# Altium footprint library ADP_Connector.PcbLib: 36 footprints (part 1 of 3)
Each footprint in its own frame and in the unit in brackets; x right, y up, seen from the top. Pads: shape width x height; smd on the part's side, far side on the other; paste and mask are expansions set on the pad; w line width, h text height; cw(c..) or ccw(c..) is an arc to the next point about the centre after c.
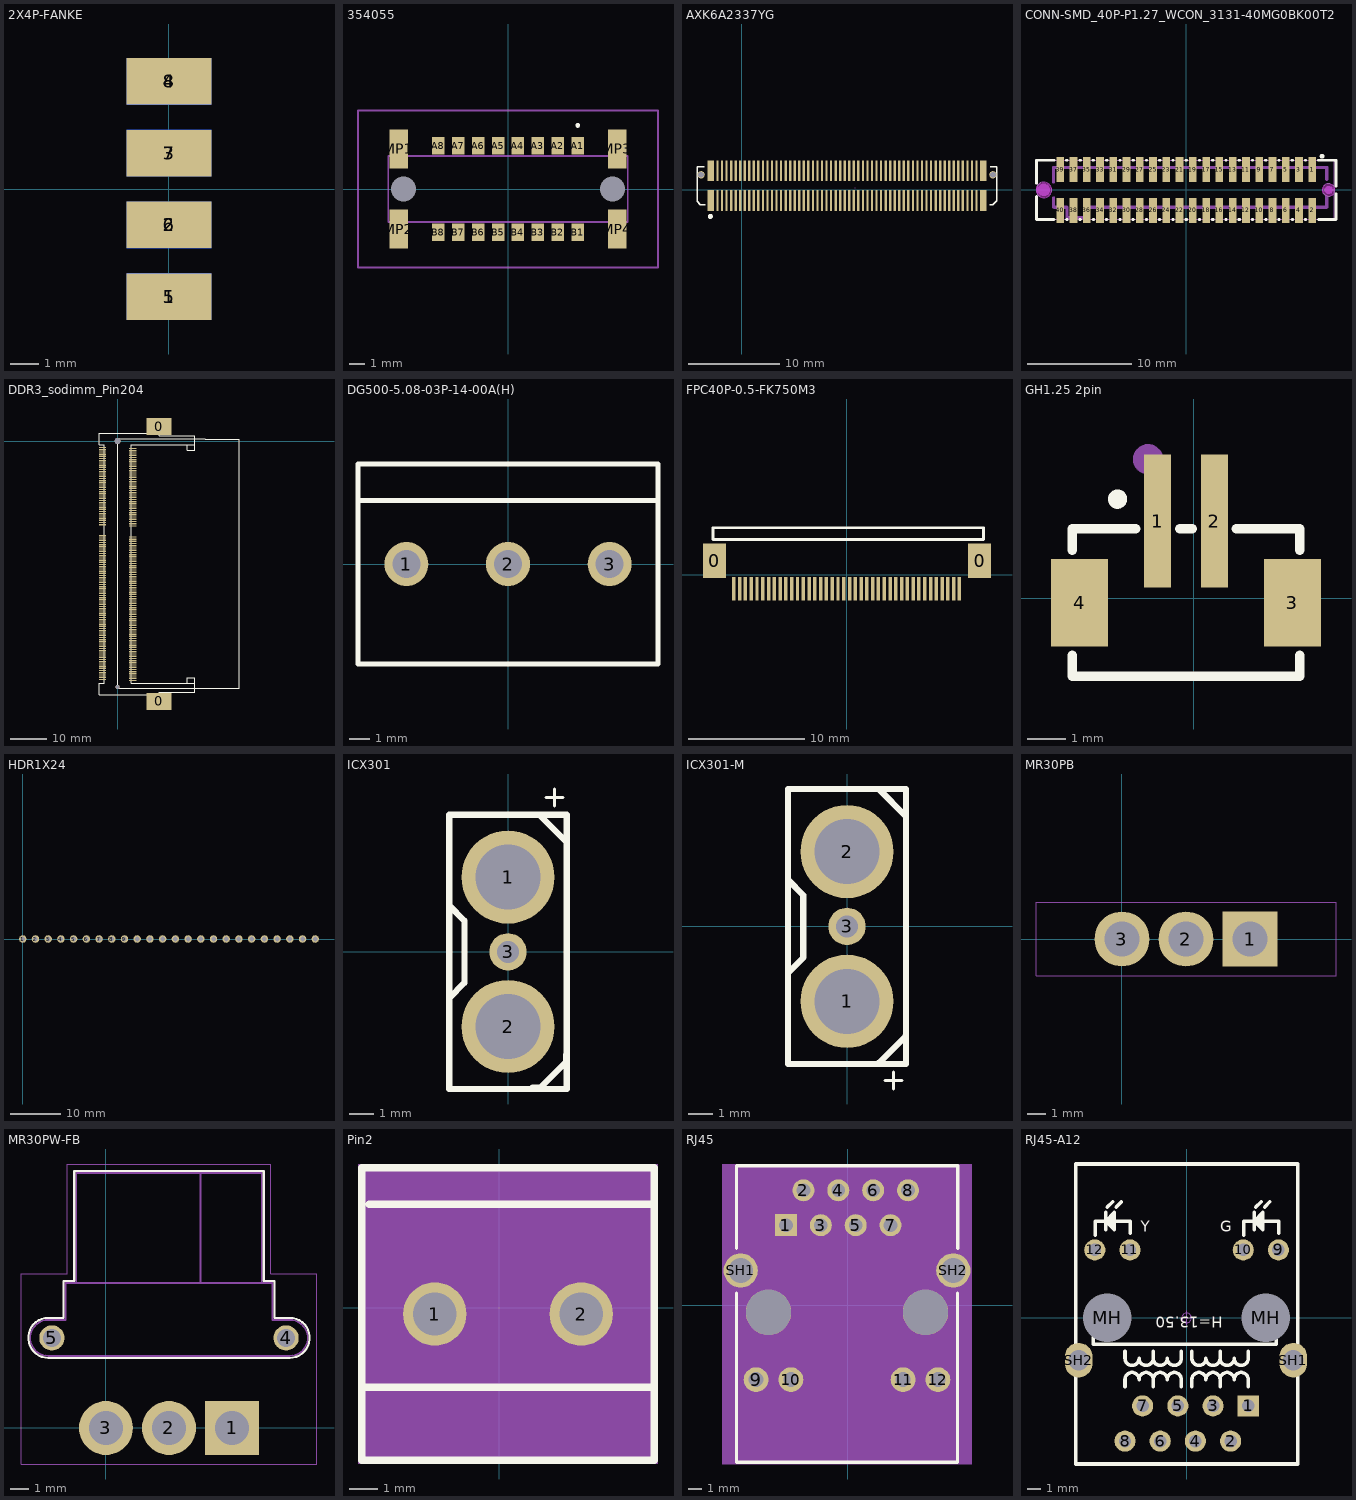
[diagram p0: the footprints below, top view; thin cyan lines are the x and y axes]

## 2X4P-FANKE [mm]
pads (8):
  rect 3x1.65 smd: 1(0,-3.81) 2(0,-1.27) 3(0,1.27) 4(0,3.81)
  rect 3x1.65 smd far side: 5(0,-3.81) 6(0,-1.27) 7(0,1.27) 8(0,3.81)
3D body "User Library-2_54mm Male Header (4x2).STEP": height 1.84, standoff -3.14, extent -1.249,-5.08 10.291,5.08

## 354055 [mm]
pads (22):
  rect 0.8x1.1 smd: A1(4.445,2.75) A2(3.175,2.75) A3(1.905,2.75) A4(0.635,2.75) A5(-0.635,2.75) A6(-1.905,2.75) A7(-3.175,2.75) A8(-4.445,2.75) B1(4.445,-2.75) B2(3.175,-2.75) B3(1.905,-2.75) B4(0.635,-2.75) B5(-0.635,-2.75) B6(-1.905,-2.75) B7(-3.175,-2.75) B8(-4.445,-2.75)
  round 0.8 hole 1.6 unplated: MH1(-6.655,0) MH2(6.655,0)
  rect 1.2x2.5 smd: MP1(-6.955,2.55) MP2(-6.955,-2.55) MP3(6.955,2.55) MP4(6.955,-2.55)
Top Overlay:
  lines w0.2: 4.445,4 ccw(c4.445,4.05) 4.445,4.1 ; 4.445,4 cw(c4.445,4.05) 4.445,4.1 ; 4.445,4 ccw(c4.445,4.05) 4.445,4.1
Mechanical 15:
  lines w0.1: -7.62,-2.1 7.62,-2.1 7.62,2.1 -7.62,2.1 -7.62,-2.1
Bottom Assembly:
  lines w0.1: -9.555,-5 9.555,-5 9.555,5 -9.555,5 -9.555,-5
3D body "354055.stp": height 5.8, standoff -4.65, extent -10,-3.376 10,3.376

## AXK6A2337YG [mm] "AXK6A2337YG-120PIN"
pads (122):
  round 0.8 hole 0.65: 1(-4.475,1.624) 2(27.625,1.624)
  rect 0.75x2.3 smd: 1(-3.425,-1.226) 2(-3.425,2.074) 119(26.575,-1.226) 120(26.575,2.074)
  rect 0.25x2.3 smd: 3(-2.675,-1.226) 4(-2.675,2.074) 5(-2.175,-1.226) 6(-2.175,2.074) 7(-1.675,-1.226) 8(-1.675,2.074) 9(-1.175,-1.226) 10(-1.175,2.074) 11(-0.675,-1.226) 12(-0.675,2.074) 13(-0.175,-1.226) 14(-0.175,2.074) 15(0.325,-1.226) 16(0.325,2.074) 17(0.825,-1.226) 18(0.825,2.074) 19(1.325,-1.226) 20(1.325,2.074) 21(1.825,-1.226) 22(1.825,2.074) 23(2.325,-1.226) 24(2.325,2.074) 25(2.825,-1.226) 26(2.825,2.074) 27(3.325,-1.226) 28(3.325,2.074) 29(3.825,-1.226) 30(3.825,2.074) 31(4.325,-1.226) 32(4.325,2.074) 33(4.825,-1.226) 34(4.825,2.074) 35(5.325,-1.226) 36(5.325,2.074) 37(5.825,-1.226) 38(5.825,2.074) 39(6.325,-1.226) 40(6.325,2.074) 41(6.825,-1.226) 42(6.825,2.074) 43(7.325,-1.226) 44(7.325,2.074) 45(7.825,-1.226) 46(7.825,2.074) 47(8.325,-1.226) 48(8.325,2.074) 49(8.825,-1.226) 50(8.825,2.074) 51(9.325,-1.226) 52(9.325,2.074) 53(9.825,-1.226) 54(9.825,2.074) 55(10.325,-1.226) 56(10.325,2.074) 57(10.825,-1.226) 58(10.825,2.074) 59(11.325,-1.226) 60(11.325,2.074) 61(11.825,-1.226) 62(11.825,2.074) 63(12.325,-1.226) 64(12.325,2.074) 65(12.825,-1.226) 66(12.825,2.074) 67(13.325,-1.226) 68(13.325,2.074) 69(13.825,-1.226) 70(13.825,2.074) 71(14.325,-1.226) 72(14.325,2.074) 73(14.825,-1.226) 74(14.825,2.074) 75(15.325,-1.226) 76(15.325,2.074) 77(15.825,-1.226) 78(15.825,2.074) 79(16.325,-1.226) 80(16.325,2.074) 81(16.825,-1.226) 82(16.825,2.074) 83(17.325,-1.226) 84(17.325,2.074) 85(17.825,-1.226) 86(17.825,2.074) 87(18.325,-1.226) 88(18.325,2.074) 89(18.825,-1.226) 90(18.825,2.074) 91(19.325,-1.226) 92(19.325,2.074) 93(19.825,-1.226) 94(19.825,2.074) 95(20.325,-1.226) 96(20.325,2.074) 97(20.825,-1.226) 98(20.825,2.074) 99(21.325,-1.226) 100(21.325,2.074) 101(21.825,-1.226) 102(21.825,2.074) 103(22.325,-1.226) 104(22.325,2.074) 105(22.825,-1.226) 106(22.825,2.074) 107(23.325,-1.226) 108(23.325,2.074) 109(23.825,-1.226) 110(23.825,2.074) 111(24.325,-1.226) 112(24.325,2.074) 113(24.825,-1.226) 114(24.825,2.074) 115(25.325,-1.226) 116(25.325,2.074) 117(25.825,-1.226) 118(25.825,2.074)
Top Overlay:
  lines w0.152: -4.122,2.524 -4.929,2.524 -4.929,-1.301 -4.554,-1.676 -4.046,-1.676 ; 27.272,-1.676 27.63,-1.676 28.079,-1.227 28.079,2.524 27.349,2.524
  lines w0.254: -3.61,-2.954 ccw(c-3.462,-2.954) -3.61,-2.947
Mechanical 1:
  text "95" at 20.325,-1.734 h0.64
  text "97" at 20.825,-1.734 h0.64
  text "73" at 14.825,-1.734 h0.64
  text "35" at 5.325,-1.734 h0.64
  text "71" at 14.325,-1.734 h0.64
  text "82" at 16.825,1.566 h0.64
  text "84" at 17.325,1.566 h0.64
  text "88" at 18.325,1.566 h0.64
  text "86" at 17.825,1.566 h0.64
  text "92" at 19.325,1.566 h0.64
  text "94" at 19.902,1.576 h0.64
  text "37" at 5.825,-1.734 h0.64
  text "91" at 19.582,-1.603 h0.64
  text "101" at 21.825,-1.988 h0.64
  text "103" at 22.325,-1.988 h0.64
  text "108" at 23.325,1.312 h0.64
  text "93" at 19.836,-1.734 h0.64
  text "107" at 23.325,-1.988 h0.64
  text "96" at 20.325,1.566 h0.64
  text "85" at 17.825,-1.734 h0.64
  text "98" at 20.825,1.566 h0.64
  text "104" at 22.325,1.312 h0.64
  text "87" at 18.325,-1.734 h0.64
  text "81" at 16.825,-1.734 h0.64
  text "105" at 22.825,-1.988 h0.64
  text "83" at 17.325,-1.734 h0.64
  text "102" at 21.825,1.312 h0.64
  text "106" at 22.825,1.312 h0.64
  text "120" at 26.575,1.312 h0.64
  text "121" at -4.475,0.862 h0.64
  text "122" at 27.625,0.862 h0.64
  text "119" at 26.575,-1.988 h0.64
  text "116" at 25.325,1.312 h0.64
  text "118" at 25.825,1.312 h0.64
  text "114" at 24.913,1.325 h0.64
  text "17" at 0.825,-1.734 h0.64
  text "15" at 0.325,-1.734 h0.64
  text "13" at -0.175,-1.734 h0.64
  text "11" at -0.357,-1.416 h0.64
  text "12" at -0.675,1.566 h0.64
  text "14" at -0.175,1.566 h0.64
  text "16" at 0.325,1.566 h0.64
  text "18" at 0.825,1.566 h0.64
  text "28" at 3.325,1.566 h0.64
  text "32" at 4.325,1.566 h0.64
  text "36" at 5.325,1.566 h0.64
  text "26" at 2.825,1.566 h0.64
  text "38" at 5.825,1.566 h0.64
  text "22" at 1.825,1.566 h0.64
  text "34" at 4.825,1.566 h0.64
  text "24" at 2.325,1.566 h0.64
  text "112" at 24.325,1.312 h0.64
  text "7" at -1.735,-0.85 h0.64
  text "3" at -2.675,-0.845 h0.64
  text "1" at -3.425,-0.845 h0.64
  text "5" at -2.175,-0.845 h0.64
  text "8" at -1.675,2.455 h0.64
  text "6" at -2.203,2.454 h0.64
  text "4" at -2.493,2.398 h0.64
  text "2" at -3.425,2.455 h0.64
  text "44" at 7.325,1.566 h0.64
  text "42" at 7.082,1.697 h0.64
  text "33" at 4.825,-1.734 h0.64
  text "31" at 4.325,-1.734 h0.64
  text "43" at 7.325,-1.734 h0.64
  text "21" at 1.825,-1.734 h0.64
  text "23" at 2.325,-1.734 h0.64
  text "25" at 2.825,-1.734 h0.64
  text "27" at 3.325,-1.734 h0.64
  text "41" at 6.825,-1.734 h0.64
  text "45" at 7.825,-1.734 h0.64
  text "47" at 8.325,-1.734 h0.64
  text "51" at 9.325,-1.734 h0.64
  text "53" at 9.825,-1.734 h0.64
  text "55" at 10.325,-1.734 h0.64
  text "57" at 10.825,-1.734 h0.64
  text "46" at 7.825,1.566 h0.64
  text "48" at 8.325,1.566 h0.64
  text "52" at 9.325,1.566 h0.64
  text "54" at 9.825,1.566 h0.64
  text "65" at 12.825,-1.734 h0.64
  text "67" at 13.325,-1.734 h0.64
  text "61" at 12.085,-1.598 h0.64
  text "63" at 12.325,-1.734 h0.64
  text "56" at 10.325,1.566 h0.64
  text "58" at 10.825,1.566 h0.64
  text "62" at 11.825,1.566 h0.64
  text "64" at 12.402,1.576 h0.64
  text "75" at 15.325,-1.734 h0.64
  text "77" at 15.825,-1.734 h0.64
  text "66" at 12.825,1.566 h0.64
  text "68" at 13.325,1.566 h0.64
  text "72" at 14.325,1.566 h0.64
  text "74" at 14.825,1.566 h0.64
  text "76" at 15.325,1.566 h0.64
  text "78" at 15.825,1.566 h0.64
  text "40" at 6.325,1.566 h0.64
  text "109" at 23.825,-1.988 h0.64
  text "110" at 23.825,1.312 h0.64
  text "99" at 21.325,-1.734 h0.64
  text "90" at 18.825,1.566 h0.64
  text "89" at 18.825,-1.734 h0.64
  text "79" at 16.325,-1.734 h0.64
  text "80" at 16.325,1.566 h0.64
  text "69" at 13.825,-1.734 h0.64
  text "70" at 13.825,1.566 h0.64
  text "59" at 11.325,-1.734 h0.64
  text "60" at 11.325,1.566 h0.64
  text "50" at 8.825,1.566 h0.64
  text "49" at 8.825,-1.734 h0.64
  text "39" at 6.325,-1.734 h0.64
  text "29" at 3.825,-1.734 h0.64
  text "30" at 3.825,1.566 h0.64
  text "19" at 1.325,-1.734 h0.64
  text "20" at 1.325,1.566 h0.64
  text "10" at -1.175,1.566 h0.64
  text "9" at -1.203,-0.846 h0.64
  text "100" at 21.325,1.312 h0.64
  text "113" at 24.825,-1.988 h0.64
  text "115" at 25.325,-1.988 h0.64
  text "111" at 24.325,-1.988 h0.64
  text "117" at 25.825,-1.988 h0.64
Mechanical 15:
  lines w0.003: 12.459,0.163 12.51,0.214

## CONN-SMD_40P-P1.27_WCON_3131-40MG0BK00T2 [mm]
pads (40):
  rect 0.74x2.4 smd: 1(12.065,1.95) 2(12.065,-1.95) 3(10.795,1.95) 4(10.795,-1.95) 5(9.525,1.95) 6(9.525,-1.95) 7(8.255,1.95) 8(8.255,-1.95) 9(6.985,1.95) 10(6.985,-1.95) 11(5.715,1.95) 12(5.715,-1.95) 13(4.445,1.95) 14(4.445,-1.95) 15(3.175,1.95) 16(3.175,-1.95) 17(1.905,1.95) 18(1.905,-1.95) 19(0.635,1.95) 20(0.635,-1.95) 21(-0.635,1.95) 22(-0.635,-1.95) 23(-1.905,1.95) 24(-1.905,-1.95) 25(-3.175,1.95) 26(-3.175,-1.95) 27(-4.445,1.95) 28(-4.445,-1.95) 29(-5.715,1.95) 30(-5.715,-1.95) 31(-6.985,1.95) 32(-6.985,-1.95) 33(-8.255,1.95) 34(-8.255,-1.95) 35(-9.525,1.95) 36(-9.525,-1.95) 37(-10.795,1.95) 38(-10.795,-1.95) 39(-12.065,1.95) 40(-12.065,-1.95)
Top Overlay:
  circle w0.254: c13.015,3.23 r0.1
  lines w0.254: -14.345,-0.625 -14.345,-2.83 -12.666,-2.83 ; -14.345,0.625 -14.345,2.83 -12.666,2.83 ; -11.464,-2.83 -11.396,-2.83 ; -11.464,2.83 -11.396,2.83 ; -10.194,-2.83 -10.126,-2.83 ; -10.194,2.83 -10.126,2.83 ; -8.924,-2.83 -8.856,-2.83 ; -8.924,2.83 -8.856,2.83 ; -7.654,-2.83 -7.586,-2.83 ; -7.654,2.83 -7.586,2.83 ; -6.384,-2.83 -6.316,-2.83 ; -6.384,2.83 -6.316,2.83 ; -5.114,-2.83 -5.046,-2.83 ; -5.114,2.83 -5.046,2.83 ; -3.844,-2.83 -3.776,-2.83 ; -3.844,2.83 -3.776,2.83 ; -2.574,-2.83 -2.506,-2.83 ; -2.574,2.83 -2.506,2.83 ; -1.304,-2.83 -1.236,-2.83 ; -1.304,2.83 -1.236,2.83 ; -0.034,-2.83 0.034,-2.83 ; -0.034,2.83 0.034,2.83 ; 1.236,-2.83 1.304,-2.83 ; 1.236,2.83 1.304,2.83 ; 2.506,-2.83 2.574,-2.83 ; 2.506,2.83 2.574,2.83 ; 3.776,-2.83 3.844,-2.83 ; 3.776,2.83 3.844,2.83 ; 5.046,-2.83 5.114,-2.83 ; 5.046,2.83 5.114,2.83 ; 6.316,-2.83 6.384,-2.83 ; 6.316,2.83 6.384,2.83 ; 7.586,-2.83 7.654,-2.83 ; 7.586,2.83 7.654,2.83 ; 8.856,-2.83 8.924,-2.83 ; 8.856,2.83 8.924,2.83 ; 10.126,-2.83 10.194,-2.83 ; 10.126,2.83 10.194,2.83 ; 11.396,-2.83 11.464,-2.83 ; 11.396,2.83 11.464,2.83 ; 12.666,-2.83 14.345,-2.83 14.345,-0.36 ; 12.666,2.83 14.345,2.83 14.345,0.36
Keep-Out Layer:
  board cut-out: -12.89,0 -12.89,0.099 -12.941,0.289 -13.04,0.461 -13.18,0.6 -13.351,0.699 -13.541,0.75 -13.739,0.75 -13.93,0.699 -14.101,0.6 -14.24,0.46 -14.339,0.289 -14.39,0.099 -14.39,0 -14.39,-0.099 -14.339,-0.29 -14.24,-0.461 -14.101,-0.6 -13.93,-0.699 -13.739,-0.75 -13.541,-0.75 -13.351,-0.699 -13.179,-0.6 -13.04,-0.461 -12.941,-0.289 -12.89,-0.099 -12.89,0
  board cut-out: 14.24,0 14.239,0.118 14.146,0.336 13.977,0.502 13.758,0.592 13.522,0.592 13.303,0.502 13.134,0.336 13.042,0.118 13.04,0 13.042,-0.118 13.134,-0.336 13.303,-0.502 13.522,-0.592 13.758,-0.592 13.977,-0.502 14.146,-0.336 14.239,-0.118 14.24,0
Mechanical 1:
  circle w0.005: c-13.64,0 r0.75
  circle w0.005: c13.64,0 r0.6
Mechanical 6:
  drawing of 4 lines, arcs and shapes, not listed
Mechanical 15:
  drawing of 45 lines, arcs and shapes, not listed

## DDR3_sodimm_Pin204 [mm]
pads (208):
  round 1.1 hole 1.1 unplated: 0(0,-66.8)
  round 1.6 hole 1.6 unplated: 0(0,0)
  rect 6.8x4.7 smd: 0(11.3,-70.75) 0(11.3,3.95)
  rect 2x0.35 smd: 1(-4.1,-1.75) 2(4.1,-2.05) 3(-4.1,-2.35) 4(4.1,-2.65) 5(-4.1,-2.95) 6(4.1,-3.25) 7(-4.1,-3.55) 8(4.1,-3.85) 9(-4.1,-4.15) 10(4.1,-4.45) 11(-4.1,-4.75) 12(4.1,-5.05) 13(-4.1,-5.35) 14(4.1,-5.65) 15(-4.1,-5.95) 16(4.1,-6.25) 17(-4.1,-6.55) 18(4.1,-6.85) 19(-4.1,-7.15) 20(4.1,-7.45) 21(-4.1,-7.75) 22(4.1,-8.05) 23(-4.1,-8.35) 24(4.1,-8.65) 25(-4.1,-8.95) 26(4.1,-9.25) 27(-4.1,-9.55) 28(4.1,-9.85) 29(-4.1,-10.15) 30(4.1,-10.45) 31(-4.1,-10.75) 32(4.1,-11.05) 33(-4.1,-11.35) 34(4.1,-11.65) 35(-4.1,-11.95) 36(4.1,-12.25) 37(-4.1,-12.55) 38(4.1,-12.85) 39(-4.1,-13.15) 40(4.1,-13.45) 41(-4.1,-13.75) 42(4.1,-14.05) 43(-4.1,-14.35) 44(4.1,-14.65) 45(-4.1,-14.95) 46(4.1,-15.25) 47(-4.1,-15.55) 48(4.1,-15.85) 49(-4.1,-16.15) 50(4.1,-16.45) 51(-4.1,-16.75) 52(4.1,-17.05) 53(-4.1,-17.35) 54(4.1,-17.65) 55(-4.1,-17.95) 56(4.1,-18.25) 57(-4.1,-18.55) 58(4.1,-18.85) 59(-4.1,-19.15) 60(4.1,-19.45) 61(-4.1,-19.75) 62(4.1,-20.05) 63(-4.1,-20.35) 64(4.1,-20.65) 65(-4.1,-20.95) 66(4.1,-21.25) 67(-4.1,-21.55) 68(4.1,-21.85) 69(-4.1,-22.15) 70(4.1,-22.45) 71(-4.1,-22.75) 72(4.1,-23.05) 73(-4.1,-25.75) 74(4.1,-26.05) 75(-4.1,-26.35) 76(4.1,-26.65) 77(-4.1,-26.95) 78(4.1,-27.25) 79(-4.1,-27.55) 80(4.1,-27.85) 81(-4.1,-28.15) 82(4.1,-28.45) 83(-4.1,-28.75) 84(4.1,-29.05) 85(-4.1,-29.35) 86(4.1,-29.65) 87(-4.1,-29.95) 88(4.1,-30.25) 89(-4.1,-30.55) 90(4.1,-30.85) 91(-4.1,-31.15) 92(4.1,-31.45) 93(-4.1,-31.75) 94(4.1,-32.05) 95(-4.1,-32.35) 96(4.1,-32.65) 97(-4.1,-32.95) 98(4.1,-33.25) 99(-4.1,-33.55) 100(4.1,-33.85) 101(-4.1,-34.15) 102(4.1,-34.45) 103(-4.1,-34.75) 104(4.1,-35.05) 105(-4.1,-35.35) 106(4.1,-35.65) 107(-4.1,-35.95) 108(4.1,-36.25) 109(-4.1,-36.55) 110(4.1,-36.85) 111(-4.1,-37.15) 112(4.1,-37.45) 113(-4.1,-37.75) 114(4.1,-38.05) 115(-4.1,-38.35) 116(4.1,-38.65) 117(-4.1,-38.95) 118(4.1,-39.25) 119(-4.1,-39.55) 120(4.1,-39.85) 121(-4.1,-40.15) 122(4.1,-40.45) 123(-4.1,-40.75) 124(4.1,-41.05) 125(-4.1,-41.35) 126(4.1,-41.65) 127(-4.1,-41.95) 128(4.1,-42.25) 129(-4.1,-42.55) 130(4.1,-42.85) 131(-4.1,-43.15) 132(4.1,-43.45) 133(-4.1,-43.75) 134(4.1,-44.05) 135(-4.1,-44.35) 136(4.1,-44.65) 137(-4.1,-44.95) 138(4.1,-45.25) 139(-4.1,-45.55) 140(4.1,-45.85) 141(-4.1,-46.15) 142(4.1,-46.45) 143(-4.1,-46.75) 144(4.1,-47.05) 145(-4.1,-47.35) 146(4.1,-47.65) 147(-4.1,-47.95) 148(4.1,-48.25) 149(-4.1,-48.55) 150(4.1,-48.85) 151(-4.1,-49.15) 152(4.1,-49.45) 153(-4.1,-49.75) 154(4.1,-50.05) 155(-4.1,-50.35) 156(4.1,-50.65) 157(-4.1,-50.95) 158(4.1,-51.25) 159(-4.1,-51.55) 160(4.1,-51.85) 161(-4.1,-52.15) 162(4.1,-52.45) 163(-4.1,-52.75) 164(4.1,-53.05) 165(-4.1,-53.35) 166(4.1,-53.65) 167(-4.1,-53.95) 168(4.1,-54.25) 169(-4.1,-54.55) 170(4.1,-54.85) 171(-4.1,-55.15) 172(4.1,-55.45) 173(-4.1,-55.75) 174(4.1,-56.05) 175(-4.1,-56.35) 176(4.1,-56.65) 177(-4.1,-56.95) 178(4.1,-57.25) 179(-4.1,-57.55) 180(4.1,-57.85) 181(-4.1,-58.15) 182(4.1,-58.45) 183(-4.1,-58.75) 184(4.1,-59.05) 185(-4.1,-59.35) 186(4.1,-59.65) 187(-4.1,-59.95) 188(4.1,-60.25) 189(-4.1,-60.55) 190(4.1,-60.85) 191(-4.1,-61.15) 192(4.1,-61.45) 193(-4.1,-61.75) 194(4.1,-62.05) 195(-4.1,-62.35) 196(4.1,-62.65) 197(-4.1,-62.95) 198(4.1,-63.25) 199(-4.1,-63.55) 200(4.1,-63.85) 201(-4.1,-64.15) 202(4.1,-64.45) 203(-4.1,-64.75) 204(4.1,-65.05)
Top Overlay:
  lines w0.15: 20.9,-65.75 18.9,-65.75 18.9,-64.35 20.9,-64.35 20.9,-65.75 ; 20.9,-65.75 20.9,-68.25 11.3,-68.25 11.3,-68.95 -5,-68.95 -5,-65.75 -3.7,-65.75 -3.7,-1.05 -5,-1.05 -5,2.15 11.3,2.15 11.3,1.45 20.9,1.45 20.9,-1.05 ; 20.9,-65.75 3.7,-65.75 3.7,-1.05 20.9,-1.05 ; 20.9,-1.05 20.9,-2.45 18.9,-2.45 18.9,-1.05 20.9,-1.05
  lines w0.152: 23.825,0.566 0,0.566 0,-67.1 33.013,-67.1 33.013,0.553 23.838,0.553

## DG500-5.08-03P-14-00A(H) [mm]
pads (3):
  round 2.2 hole 1.4: 1(-5.08,0) 2(0,0) 3(5.08,0)
Top Overlay:
  lines w0.254: -7.493,3.175 7.366,3.175 ; -7.5,-5 -7.5,5 7.5,5 7.5,-5 -7.5,-5
Mechanical 15:
  lines w0.003: 0.266,0.364 0.317,0.415

## FPC40P-0.5-FK750M3 [mm]
pads (42):
  rect 2x3 smd: 0(-11.465,1.202) 0(11.465,1.202)
  rect 0.3x2 smd: 1(9.721,-1.202) 2(9.221,-1.202) 3(8.721,-1.202) 4(8.221,-1.202) 5(7.721,-1.202) 6(7.221,-1.202) 7(6.721,-1.202) 8(6.221,-1.202) 9(5.721,-1.202) 10(5.221,-1.202) 11(4.721,-1.202) 12(4.221,-1.202) 13(3.721,-1.202) 14(3.221,-1.202) 15(2.721,-1.202) 16(2.221,-1.202) 17(1.721,-1.202) 18(1.221,-1.202) 19(0.721,-1.202) 20(0.221,-1.202) 21(-0.279,-1.202) 22(-0.779,-1.202) 23(-1.279,-1.202) 24(-1.779,-1.202) 25(-2.279,-1.202) 26(-2.779,-1.202) 27(-3.279,-1.202) 28(-3.779,-1.202) 29(-4.279,-1.202) 30(-4.779,-1.202) 31(-5.279,-1.202) 32(-5.779,-1.202) 33(-6.279,-1.202) 34(-6.779,-1.202) 35(-7.279,-1.202) 36(-7.779,-1.202) 37(-8.279,-1.202) 38(-8.779,-1.202) 39(-9.279,-1.202) 40(-9.779,-1.202)
Top Overlay:
  lines w0.254: -11.585,3.049 -11.585,4.065 11.815,4.065 11.815,3.049 -11.585,3.049
3D body "User Library-FPC-40-2.STEP": height 1.95, standoff 0, extent -12.23,-1.755 12.17,4.545

## GH1.25 2pin [mm]
pads (4):
  rect 0.7x3.5 smd: 1(-0.955,2.034) 2(0.545,2.034)
  rect 1.5x2.3 smd: 3(2.595,-0.116) 4(-3.005,-0.116)
Top Overlay:
  circle w0.254: c-2.007,2.61 r0.127
  lines w0.254: -3.205,-1.497 -3.205,-2.054 2.795,-2.054 2.795,-1.497 ; -3.205,1.265 -3.205,1.834 -1.536,1.834 ; -0.374,1.834 -0.036,1.834 ; 1.126,1.834 2.794,1.834 2.794,1.265
Mechanical 15:
  circle w0.4: c-1.205,3.659 r0.2

## HDR1X24 [mm] "Connector; Header; 24 Position"
pads (24):
  round 1.5 hole 0.9: 1(0,0) 2(2.54,0) 3(5.08,0) 4(7.62,0) 5(10.16,0) 6(12.7,0) 7(15.24,0) 8(17.78,0) 9(20.32,0) 10(22.86,0) 11(25.4,0) 12(27.94,0) 13(30.48,0) 14(33.02,0) 15(35.56,0) 16(38.1,0) 17(40.64,0) 18(43.18,0) 19(45.72,0) 20(48.26,0) 21(50.8,0) 22(53.34,0) 23(55.88,0) 24(58.42,0)

## ICX301 [mm] "ICX301-F"
pads (3):
  round 3.8 hole 2.65: 1(0,3.05) 2(0,-3.05)
  round 1.524 hole 0.9: 3(0,0)
Top Overlay:
  lines w0.127: 1.545,6.3 2.245,6.3 ; 1.9,5.95 1.9,6.65
  lines w0.254: -2.4,-2.39 -2.4,-1.892 -1.778,-1.27 -1.778,1.27 -2.4,1.892 -2.4,2.416 ; 0,5.6 2.4,5.6 ; 1.003,-5.547 1.311,-5.547 2.37,-4.488 2.37,-4.204 ; 1.285,5.6 2.4,4.485 2.4,4.433 ; 2.4,5.6 2.4,-5.6 -2.4,-5.6 -2.4,5.6 2.4,5.6

## ICX301-M [mm]
pads (3):
  round 3.8 hole 2.65: 1(0,-3.05) 2(0,3.05)
  round 1.524 hole 0.9: 3(0,0)
Top Overlay:
  lines w0.127: 1.545,-6.273 2.245,-6.273 ; 1.9,-6.623 1.9,-5.923
  lines w0.254: -2.4,-2.39 -2.4,-1.892 -1.778,-1.27 -1.778,1.27 -2.4,1.892 -2.4,2.416 ; 0,5.6 2.4,5.6 ; 1.285,5.6 2.4,4.485 2.4,4.433 ; 1.311,-5.547 2.37,-4.488 ; 2.4,5.6 2.4,-5.6 -2.4,-5.6 -2.4,5.6 2.4,5.6

## MR30PB [mm]
pads (3):
  rect 3x3 hole 1.9 paste+0: 1(7,0)
  round 3 hole 1.9 paste+0: 2(3.5,0) 3(0,0)
Mechanical 6:
  lines w0.05: -4.7,-2 11.7,-2 11.7,2 -4.7,2 -4.7,-2

## MR30PW-FB [mm]
pads (5):
  rect 3x3 hole 1.9 paste+0: 1(7,0)
  round 3 hole 1.9 paste+0: 2(3.5,0) 3(0,0)
  round 1.4 hole 1 paste+0: 4(10,5) 5(-3,5)
Top Overlay:
  lines w0.12: -3.2,3.89 cw(c-3.2,5) -3.2,6.11 -2.36,6.11 -2.36,8.16 -1.76,8.16 -1.76,14.26 8.76,14.26 8.76,8.16 9.36,8.16 9.36,6.11 10.2,6.11 cw(c10.2,5) 10.2,3.89 -3.2,3.89
Mechanical 6:
  lines w0.05: -4.7,-2 11.7,-2 11.7,8.55 9.15,8.55 9.15,14.65 -2.15,14.65 -2.15,8.55 -4.7,8.55 -4.7,-2
Mechanical 15:
  lines w0.1: -2.25,6 -3.2,6 ccw(c-3.2,5) -3.2,4 10.2,4 ccw(c10.2,5) 10.2,6 9.255,6 ; -2.25,6.05 -2.25,8.05 9.25,8.05 9.25,6 ; -1.65,8.05 -1.65,14.15 8.65,14.15 8.65,8.05 ; 5.25,8.05 5.25,14.15

## Pin2 [mm]
pads (2):
  round 2.2 hole 1.5: 1(-2.244,-0.211) 2(2.836,-0.211)
Top Overlay:
  lines w0.254: -4.784,-2.751 5.376,-2.751 ; -4.53,3.599 5.376,3.599 ; -4.784,-5.291 -4.784,4.869 5.376,4.869 5.376,-5.291 -4.784,-5.291
Mechanical 4:
  region: -4.911,4.996 5.503,4.996 5.503,-5.418 -4.911,-5.418
Mechanical 5:
  region: -3.344,0.889 -1.144,0.889 -1.144,-1.311 -3.344,-1.311
  region: 1.736,0.889 3.936,0.889 3.936,-1.311 1.736,-1.311
Mechanical 15:
  lines w0.003: 0.059,0.218 0.11,0.269

## RJ45 [mm]
pads (16):
  rect 1.6x1.6 hole 1: 1(-4.496,5.84)
  round 1.6 hole 1: 2(-3.226,8.38) 3(-1.956,5.84) 4(-0.686,8.38) 5(0.584,5.84) 6(1.854,8.38) 7(3.124,5.84) 8(4.394,8.38)
  round 1.8 hole 1.1: 9(-6.676,-5.41) 10(-4.136,-5.41) 11(4.034,-5.41) 12(6.574,-5.41)
  round 2.5 hole 1.8: SH1(-7.796,2.54) SH2(7.694,2.54)
  round 3.3 hole 3.3 unplated: ""(-5.766,-0.51) ""(5.664,-0.51)
Top Overlay:
  lines w0.254: -8.101,0.87 -8.101,-11.43 7.999,-11.43 7.999,0.87 ; -8.101,4.17 -8.101,10.17 7.999,10.17 8,4.17
Mechanical 4:
  circle w1.65: c5.664,-0.51 r0.825
  circle w1.65: c-5.766,-0.51 r0.825
  region: -9.144,10.297 9.042,10.297 9.042,-11.557 -9.144,-11.557
Mechanical 5:
  circle w0.127: c5.664,-0.51 r1.65
  circle w0.127: c-5.766,-0.51 r1.65
  region: 6.444,3.79 8.944,3.79 8.944,1.29 6.444,1.29
  region: -9.046,3.79 -6.546,3.79 -6.546,1.29 -9.046,1.29
  region: 5.674,-4.51 7.474,-4.51 7.474,-6.31 5.674,-6.31
  region: 3.134,-4.51 4.934,-4.51 4.934,-6.31 3.134,-6.31
  region: -5.036,-4.51 -3.236,-4.51 -3.236,-6.31 -5.036,-6.31
  region: -7.576,-4.51 -5.776,-4.51 -5.776,-6.31 -7.576,-6.31
  region: 3.594,9.18 5.194,9.18 5.194,7.58 3.594,7.58
  region: 2.324,6.64 3.924,6.64 3.924,5.04 2.324,5.04
  region: 1.054,9.18 2.654,9.18 2.654,7.58 1.054,7.58
  region: -0.216,6.64 1.384,6.64 1.384,5.04 -0.216,5.04
  region: -1.486,9.18 0.114,9.18 0.114,7.58 -1.486,7.58
  region: -2.756,6.64 -1.156,6.64 -1.156,5.04 -2.756,5.04
  region: -4.026,9.18 -2.426,9.18 -2.426,7.58 -4.026,7.58
  region: -5.296,6.64 -3.696,6.64 -3.696,5.04 -5.296,5.04
Mechanical 15:
  lines w0.003: -0.076,0.215 -0.025,0.265

## RJ45-A12 [mil] "网线接口"
height 665.35
pads (16):
  rect 60x60 hole 35.43: 1(175,-250)
  round 60 hole 35.43: 2(125,-350) 3(75,-250) 4(25,-350) 5(-25,-250) 6(-75,-350) 7(-125,-250) 8(-175,-350) 9(260.83,192.91) 10(160.83,192.91) 11(-160.82,192.91) 12(-260.82,192.91)
  round 130 hole 137.8: MH(-225,0) MH(225,0)
  oval 78.74x98.43 hole 59.06: SH1(302.96,-120.08) SH2(-306.49,-120.08)
Top Overlay:
  lines w9.84: -260,234.8 -260,274.8 -160,274.8 -160,239.8 ; -230,249.8 -230,299.8 ; -225,314.8 -210,329.8 ; -213.92,259.34 -213.92,290.88 ; -200,314.8 -185,329.8 ; 161.65,234.8 161.65,274.8 261.65,274.8 261.65,239.8 ; 191.65,249.8 191.65,299.8 ; 196.65,314.8 211.65,329.8 ; 207.73,259.34 207.73,290.88 ; 221.65,314.8 236.65,329.8 ; -230,274.8 -205,249.8 -205,299.8 -230,274.8 ; 191.65,274.8 216.65,249.8 216.65,299.8 191.65,274.8
  lines w10: -265,-55 -265,-75 255,-75 255,-55 ; -175,-195 -175,-175 cw(c-155,-175) -135,-175 cw(c-115,-175) -95,-175 ; -175,-95 -175,-115 ccw(c-155,-115) -135,-115 ccw(c-115,-115) -95,-115 ; -95,-195 -95,-175 ; -95,-95 -95,-115 ; -15,-195 -15,-175 ccw(c-35,-175) -55,-175 ccw(c-75,-175) -95,-175 ; -15,-95 -15,-115 cw(c-35,-115) -55,-115 cw(c-75,-115) -95,-115 ; 15,-195 15,-175 cw(c35,-175) 55,-175 cw(c75,-175) 95,-175 ; 15,-95 15,-115 ccw(c35,-115) 55,-115 ccw(c75,-115) 95,-115 ; 95,-195 95,-175 ; 95,-95 95,-115 ; 175,-195 175,-175 ccw(c155,-175) 135,-175 ccw(c115,-175) 95,-175 ; 175,-95 175,-115 cw(c155,-115) 135,-115 cw(c115,-115) 95,-115 ; -315,-415 -315,437.01 315,437.01 315,-415 -315,-415
  text "H=13.50" at 101.94,3.75 h31.5
  text "Y" at -130,244.8 h31.5
  text "G" at 95,244.8 h31.5
Mechanical 15:
  circle w1.97: c0,0 r13.78
  lines w1.97: -19.69,0 19.68,0 ; 0,-19.68 0,19.69
3D body "HanRun-HR911105A.STEP": height 59.06, standoff -590.55, extent -311.37,-412.34 313.83,430.18